# Altium footprint library Chestin_PcbLib.PcbLib: 203 footprints (part 1 of 13)
Each footprint in its own frame and in the unit in brackets; x right, y up, seen from the top. Pads: shape width x height; smd on the part's side, far side on the other; paste and mask are expansions set on the pad; w line width, h text height; cw(c..) or ccw(c..) is an arc to the next point about the centre after c.
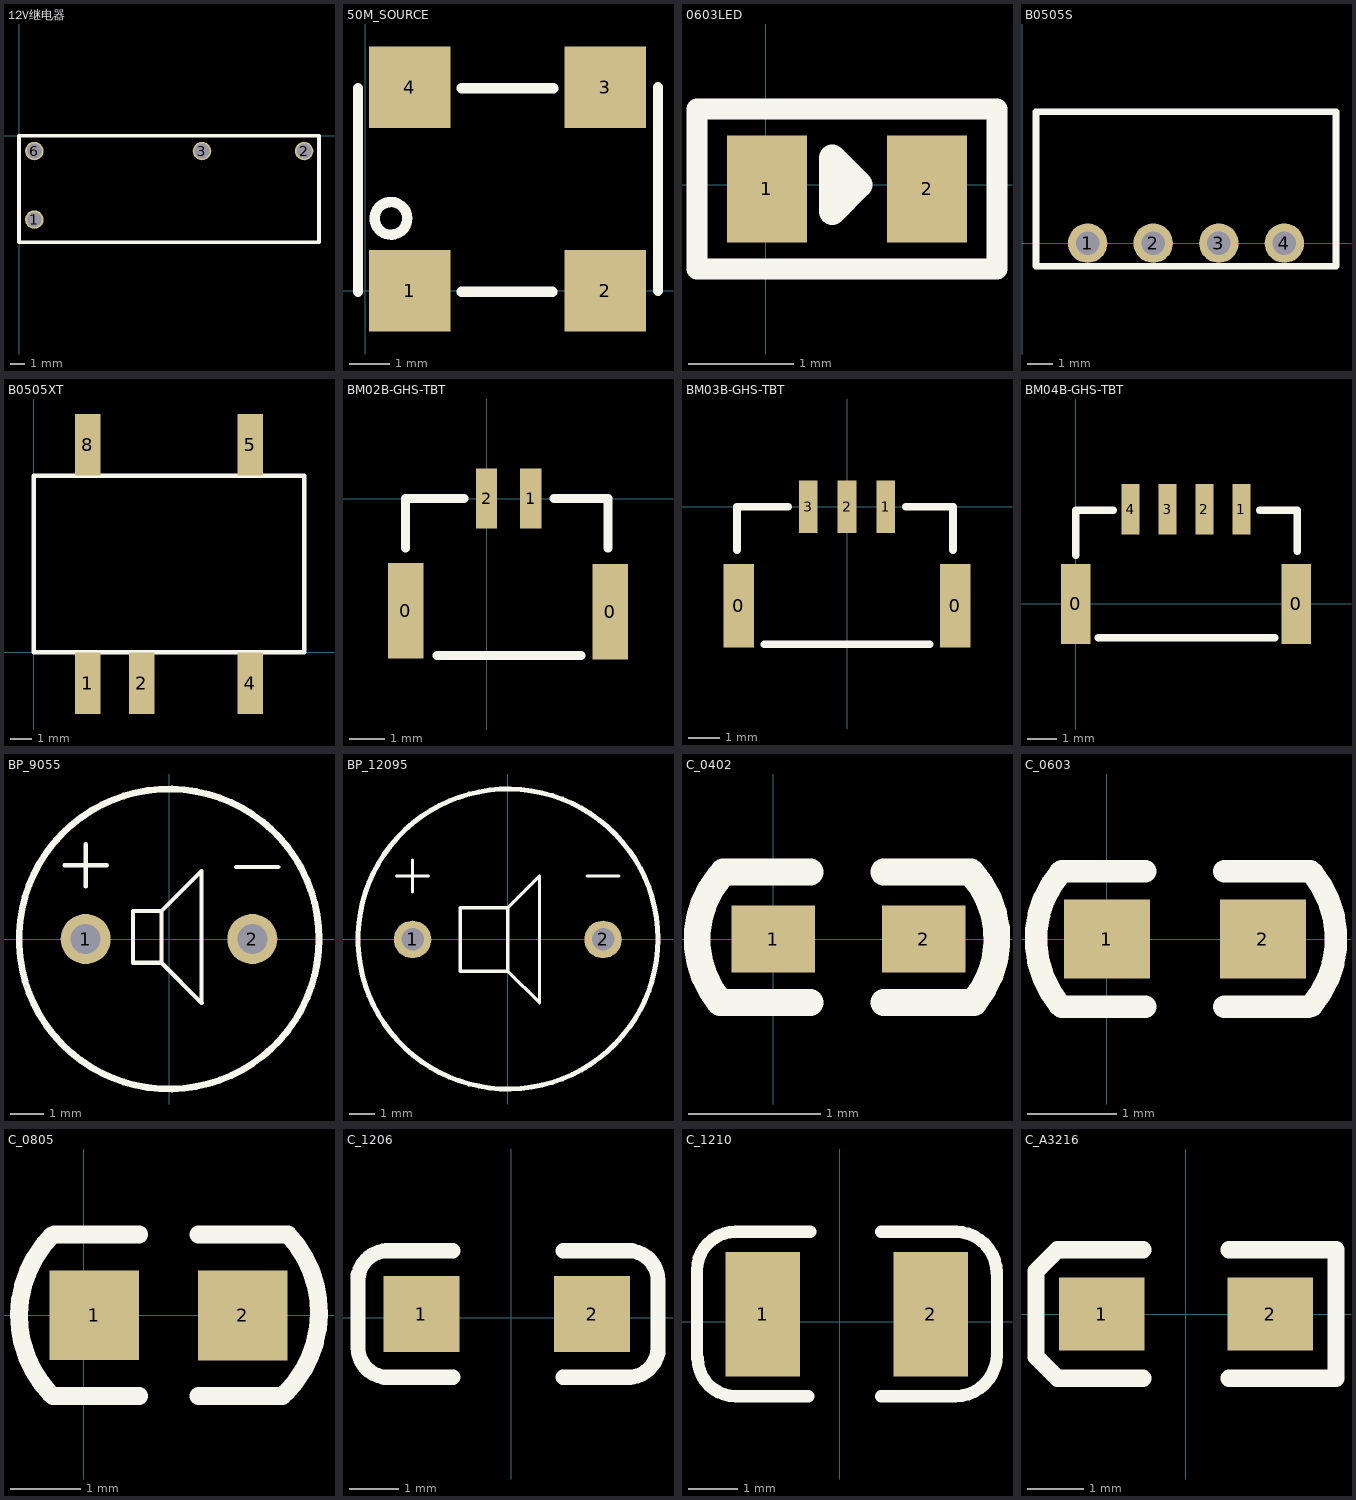
[diagram p0: the footprints below, top view; thin cyan lines are the x and y axes]

## 12V继电器 [mm]
pads (4):
  round 1.27 hole 1: 1(1.05,-5.75) 2(19.55,-1.05) 3(12.55,-1.05) 6(1.05,-1.05)
Top Overlay:
  lines w0.254: 0,-7.308 16.075,-7.308 18.796,-7.308 20.574,-7.308 20.574,0 0,0 0,-3.429 ; 0,-7.2 0,-3.048

## 50M_SOURCE [mm]
pads (4):
  rect 2x2 smd: 1(1.1,0) 2(5.9,0) 3(5.9,5) 4(1.1,5)
Top Overlay:
  circle w0.254: c0.635,1.778 r0.402
  lines w0.254: -0.175,-0.025 -0.175,4.975 ; 2.375,-0.025 4.6,-0.025 ; 2.375,4.975 4.625,4.975 ; 7.2,0 7.2,5

## 0603LED [mil]
pads (2):
  rect 30x40 smd: 1(0.5,-1.59) 2(60.5,-1.59)
Top Overlay:
  lines w7.87: 86.64,-31.63 86.64,28.41 -25.65,28.41 -25.65,-31.59 86.64,-31.59
  lines w10: 25,-10 25,10 35,0 25,-10
3D body "User Library-led_0603.STEP": height 23.62, standoff 0, extent -1.89,-15.75 61.89,15.75

## B0505S [mil] "B0505S"
pads (4):
  round 60 hole 35.43: 1(100,0) 2(200,0) 3(300,0) 4(400,0)
Top Overlay:
  lines w10: 21.26,-35.43 21.26,200.79 478.74,200.79 478.74,-35.43 21.26,-35.43

## B0505XT [mm]
pads (5):
  rect 1.2x2.9 smd: 1(2.54,-1.45) 2(5.08,-1.45) 4(10.16,-1.45) 5(10.16,9.75) 8(2.54,9.75)
Top Overlay:
  lines w0.203: 0,0 0,8.3 12.7,8.3 12.7,0 0,0
3D body "B0505XT_1.STEP": height 7.3, standoff 0.05, extent -0.127,-1.282 12.573,9.918

## BM02B-GHS-TBT [mm]
pads (4):
  rect 1x2.7 smd: 0(-2.286,-3.175) 0(3.5,-3.2)
  rect 0.6x1.7 smd: 1(1.25,0) 2(0,0)
Top Overlay:
  lines w0.254: -2.286,-1.397 -2.286,0 -0.635,0 ; -1.397,-4.445 2.667,-4.445 ; 1.905,0 3.429,0 3.429,-1.397

## BM03B-GHS-TBT [mm]
height 0.051
pads (5):
  rect 1x2.7 smd: 0(-3.5,-3.2) 0(3.5,-3.2)
  rect 0.6x1.7 smd: 1(1.25,0) 2(0,0) 3(-1.25,0)
Top Overlay:
  lines w0.254: -3.556,-1.397 -3.556,0 -1.905,0 ; -2.667,-4.445 2.667,-4.445 ; 1.905,0 3.429,0 3.429,-1.397

## BM04B-GHS-TBT [mm]
height 1.45
pads (6):
  rect 1x2.7 smd: 0(0,0) 0(7.45,0)
  rect 0.6x1.7 smd: 1(5.6,3.2) 2(4.35,3.2) 3(3.1,3.2) 4(1.85,3.2)
Top Overlay:
  lines w0.254: 0,1.651 0,3.175 1.27,3.175 ; 0.762,-1.143 6.731,-1.143 ; 6.223,3.175 7.493,3.175 7.493,1.778

## BP_9055 [mm]
pads (2):
  round 1.5 hole 0.9: 1(-2.5,0) 2(2.5,0)
Top Overlay:
  circle w0.2: c0,0 r4.5
  lines w0.127: -3.135,2.21 -1.865,2.21 ; -2.5,1.575 -2.5,2.845 ; -0.229,-0.65 -0.229,0.838 ; 2.007,2.159 3.277,2.159 ; -0.229,0.838 -1.081,0.838 -1.081,-0.711 -0.229,-0.711 0.98,-1.92 0.976,-1.92 0.976,2.043 -0.229,0.838
3D body "BUZZER.STEP": height 6, standoff -5.5, extent -4.504,-4.504 4.496,4.496

## BP_12095 [mm]
pads (2):
  round 1.5 hole 0.9: 1(-3.81,0) 2(3.81,0)
Top Overlay:
  circle w0.2: c0.008,0.018 r6
  lines w0.127: -4.445,2.54 -3.175,2.54 ; -3.81,1.905 -3.81,3.175 ; 3.175,2.54 4.445,2.54 ; 0,-1.27 0,1.27 ; 0,-1.27 1.27,-2.54 1.27,2.54 0,1.27 ; 0,-1.27 -1.905,-1.27 -1.905,1.27 0,1.27

## C_0402 [mil] "1005"
pads (2):
  rect 25x20 smd: 1(0,0) 2(45,0)
Top Overlay:
  lines w8: -15.94,-19 11,-19 ; -15.94,-18.95 cw(c6.42,-0.05) -15.95,18.84 ; -15,20 11,20 ; 33,-19 59.95,-19 ; 33,20 59,20 cw(c37.58,0.05) 59.95,-18.84
3D body "cap_0402.STEP": height 19.68, standoff 0, extent 2.31,-10 41.69,9.69

## C_0603 [mil] "1608"
pads (2):
  rect 38x35 smd: 1(0,0) 2(69,0)
Top Overlay:
  lines w10: -21,-29 cw(c14.45,-0.04) -20.48,29.56 ; -20,-30 17,-30 ; -20,30 17,30 ; 52,-30 89,-30 ; 52,30 90,30 ; 90.48,-29.56 ccw(c55.55,0.04) 91,29
3D body "User Library-0603 SMD Capacitor.STEP": height 11.89, standoff 0, extent 3.8,-15.8 66.8,15.7

## C_0805 [mil] "2012"
pads (2):
  rect 50x50 smd: 1(6,0) 2(88.7,-0.1)
Top Overlay:
  lines w10: -18.66,-43.67 cw(c27.24,-0.08) -17.7,44.5 ; -17.2,-45 31,-45 ; -16.3,45 31,45 ; 64,-45 111,-45 ; 64,45 113.1,45 ; 112.92,-43.04 ccw(c67.98,1.54) 114,45
3D body "User Library-0805 SMD Capacitor.STEP": height 30.39, standoff -0.39, extent 7.93,-24.5 86.67,24.71

## C_1206 [mil] "3216"
pads (2):
  rect 60x60 smd: 1(-71,3) 2(64,3)
Top Overlay:
  lines w11.81: -121,-23 ccw(c-97.5,-23.5) -98,-47 ; -121,30 cw(c-97.5,29.5) -97,53 ; 92,-47 ccw(c92.5,-23.5) 116,-24 ; 93,53 cw(c92.5,29.5) 116,29
  lines w12: -121,-24 -121,34 ; -100,-47 -46,-47 ; -99,53 -46,53 ; 41,-47 94,-47 ; 41,53 95,53 ; 116,-28 116,30
3D body "Capacitor 1206 SMD1.step": height 39.45, standoff 0, extent -66.99,-28.49 58.99,34.5

## C_1210 [mil]
pads (2):
  rect 60x100 smd: 1(-62,6) 2(73,6)
Top Overlay:
  lines w10: -114.8,-29.36 -114.8,41.08 cw(c-83.75,41.08) -83.75,72.13 ; -114.27,-29.36 ccw(c-83.63,-29.36) -83.63,-60 -25.3,-60 ; -83.75,72 -24,72 ; 33,-60 92.52,-60 ccw(c92.52,-26.32) 126.2,-26.32 126.2,39.82 ; 33,72 93.32,72 ; 93,72 cw(c93,39.12) 125.88,39.12
3D body "1210(3225M) Cap.STEP": height 67.1, standoff 0, extent -72.75,-44 84.75,54

## C_A3216 [mil]
pads (2):
  rect 60x51.18 smd: 1(-59,0) 2(59,0)
Top Overlay:
  lines w12: -30,-45 -90,-45 -105,-30 -105,30 -90,45 -30,45 ; 30,-45 105,-45 105,45 30,45
3D body "TAJ-A.STEP": height 62.99, standoff 0, extent -63,-31 62.99,31.99